# Altium footprint library Библиотека посадочных мест.PcbLib: 128 footprints (part 3 of 8)
Each footprint in its own frame and in the unit in brackets; x right, y up, seen from the top. Pads: shape width x height; smd on the part's side, far side on the other; paste and mask are expansions set on the pad; w line width, h text height; cw(c..) or ccw(c..) is an arc to the next point about the centre after c.
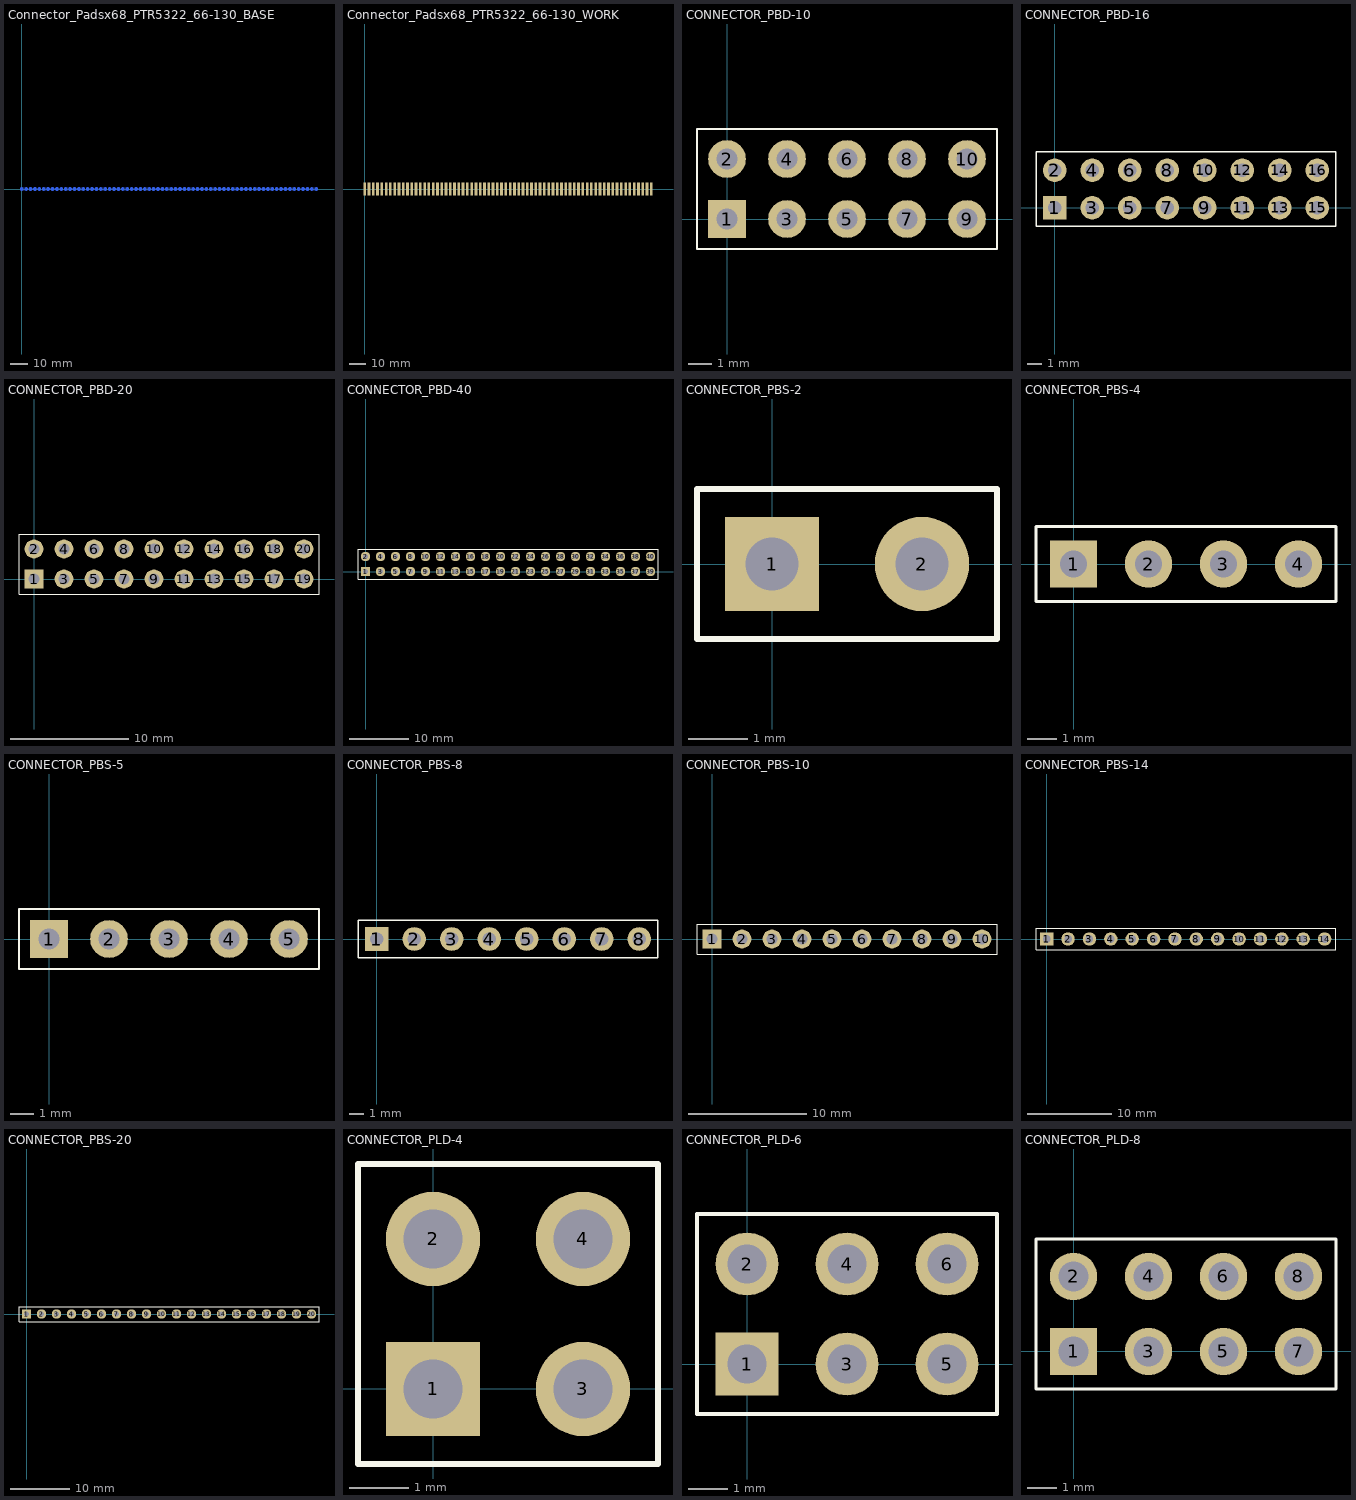
[diagram p2: the footprints below, top view; thin cyan lines are the x and y axes]

## Connector_Padsx68_PTR5322_66-130_BASE [mm]
pads (68):
  round 1.9 smd far side: 66(2.54,0) 67(5.08,0) 68(7.62,0) 69(10.16,0) 70(12.7,0) 71(15.24,0) 72(17.78,0) 73(20.32,0) 74(22.86,0) 75(25.4,0) 76(27.94,0) 77(30.48,0) 78(33.02,0) 79(35.56,0) 80(38.1,0) 81(40.64,0) 82(43.18,0) 83(45.72,0) 84(48.26,0) 85(50.8,0) 86(53.34,0) 87(55.88,0) 88(58.42,0) 89(60.96,0) 90(63.5,0) 91(66.04,0) 92(68.58,0) 93(71.12,0) 94(73.66,0) 95(76.2,0) 96(78.74,0) 97(81.28,0) 98(83.82,0) 99(86.36,0) 100(88.9,0) 101(91.44,0) 102(93.98,0) 103(96.52,0) 104(99.06,0) 105(101.6,0) 106(104.14,0) 107(106.68,0) 108(109.22,0) 109(111.76,0) 110(114.3,0) 111(116.84,0) 112(119.38,0) 113(121.92,0) 114(124.46,0) 115(127,0) 116(129.54,0) 117(132.08,0) 118(134.62,0) 119(137.16,0) 120(139.7,0) 121(142.24,0) 122(144.78,0) 123(147.32,0) 124(149.86,0) 125(152.4,0) 126(154.94,0) 127(157.48,0) 128(160.02,0) 129(162.56,0) 130(165.1,0) NC(0,0) NC(167.64,0) NC(170.18,0)
Bottom Overlay:
  lines w0.254: -1.587,-0.635 -1.587,-0.318 -1.587,1.587 0.953,1.587 171.767,1.587 171.767,-1.587 -0.635,-1.587 -1.587,-0.635
3D body "FKB 5322_1-04-65 (4).STEP": height 6.5, standoff 0, extent -1.27,-1.27 8.89,1.27
3D body "FKB 5322_1-04-65 (4).STEP": height 6.5, standoff 0, extent 29.21,-1.27 39.37,1.27
3D body "FKB 5322_1-04-65 (4).STEP": height 6.5, standoff 0, extent 39.37,-1.27 49.53,1.27
3D body "FKB 5322_1-04-65 (4).STEP": height 6.5, standoff 0, extent 49.53,-1.27 59.69,1.27
3D body "FKB 5322_1-04-65 (4).STEP": height 6.5, standoff 0, extent 59.69,-1.27 69.85,1.27
3D body "FKB 5322_1-04-65 (4).STEP": height 6.5, standoff 0, extent 69.85,-1.27 80.01,1.27
3D body "FKB 5322_1-04-65 (4).STEP": height 6.5, standoff 0, extent 80.01,-1.27 90.17,1.27
3D body "FKB 5322_1-04-65 (4).STEP": height 6.5, standoff 0, extent 90.17,-1.27 100.33,1.27
3D body "FKB 5322_1-04-65 (4).STEP": height 6.5, standoff 0, extent 100.33,-1.27 110.49,1.27
3D body "FKB 5322_1-04-65 (4).STEP": height 6.5, standoff 0, extent 110.49,-1.27 120.65,1.27
3D body "FKB 5322_1-04-65 (4).STEP": height 6.5, standoff 0, extent 120.65,-1.27 130.81,1.27
3D body "FKB 5322_1-04-65 (4).STEP": height 6.5, standoff 0, extent 130.81,-1.27 140.97,1.27
3D body "FKB 5322_1-04-65 (4).STEP": height 6.5, standoff 0, extent 140.97,-1.27 151.13,1.27
3D body "FKB 5322_1-04-65 (4).STEP": height 6.5, standoff 0, extent 151.13,-1.27 161.29,1.27
3D body "FKB 5322_1-04-65 (4).STEP": height 6.5, standoff 0, extent 161.29,-1.27 171.45,1.27
3D body "FKB 5322_1-04-65 (4).STEP": height 6.5, standoff 0, extent 19.05,-1.27 29.21,1.27
3D body "FKB 5322_1-04-65 (4).STEP": height 6.5, standoff 0, extent 8.89,-1.27 19.05,1.27

## Connector_Padsx68_PTR5322_66-130_WORK [mm]
pads (68):
  rect 1.6x8 smd: 66(2.54,0) 67(5.08,0) 68(7.62,0) 69(10.16,0) 70(12.7,0) 71(15.24,0) 72(17.78,0) 73(20.32,0) 74(22.86,0) 75(25.4,0) 76(27.94,0) 77(30.48,0) 78(33.02,0) 79(35.56,0) 80(38.1,0) 81(40.64,0) 82(43.18,0) 83(45.72,0) 84(48.26,0) 85(50.8,0) 86(53.34,0) 87(55.88,0) 88(58.42,0) 89(60.96,0) 90(63.5,0) 91(66.04,0) 92(68.58,0) 93(71.12,0) 94(73.66,0) 95(76.2,0) 96(78.74,0) 97(81.28,0) 98(83.82,0) 99(86.36,0) 100(88.9,0) 101(91.44,0) 102(93.98,0) 103(96.52,0) 104(99.06,0) 105(101.6,0) 106(104.14,0) 107(106.68,0) 108(109.22,0) 109(111.76,0) 110(114.3,0) 111(116.84,0) 112(119.38,0) 113(121.92,0) 114(124.46,0) 115(127,0) 116(129.54,0) 117(132.08,0) 118(134.62,0) 119(137.16,0) 120(139.7,0) 121(142.24,0) 122(144.78,0) 123(147.32,0) 124(149.86,0) 125(152.4,0) 126(154.94,0) 127(157.48,0) 128(160.02,0) 129(162.56,0) 130(165.1,0) NC(167.64,0) NC(170.18,0)
  rect 1.6x8 smd mask+0.102: NC(0,0)

## CONNECTOR_PBD-10 [mm]
pads (10):
  rect 1.6x1.6 hole 0.9: 1(0,0)
  round 1.6 hole 0.9: 2(0,2.54) 3(2.54,0) 4(2.54,2.54) 5(5.08,0) 6(5.08,2.54) 7(7.62,0) 8(7.62,2.54) 9(10.16,0) 10(10.16,2.54)
Top Overlay:
  lines w0.1: -1.27,-1.27 -1.27,1.27 -1.27,3.81 3.81,3.81 11.43,3.81 11.43,-1.27 3.81,-1.27 -1.27,-1.27
3D body "PBD-10.STEP": height 8.5, standoff -3.15, extent -1.27,-1.27 11.43,3.81

## CONNECTOR_PBD-16 [mm]
pads (16):
  rect 1.6x1.6 hole 0.9: 1(0,0)
  round 1.6 hole 0.9: 2(0,2.54) 3(2.54,0) 4(2.54,2.54) 5(5.08,0) 6(5.08,2.54) 7(7.62,0) 8(7.62,2.54) 9(10.16,0) 10(10.16,2.54) 11(12.7,0) 12(12.7,2.54) 13(15.24,0) 14(15.24,2.54) 15(17.78,0) 16(17.78,2.54)
Top Overlay:
  lines w0.1: -1.27,-1.27 3.81,-1.27 19.05,-1.27 19.05,3.81 3.81,3.81 -1.27,3.81 -1.27,1.27 -1.27,-1.27
3D body "PBD-16.STEP": height 8.5, standoff -3.15, extent -1.27,-1.27 19.05,3.81

## CONNECTOR_PBD-20 [mm]
pads (20):
  rect 1.6x1.6 hole 0.9: 1(0,0)
  round 1.6 hole 0.9: 2(0,2.54) 3(2.54,0) 4(2.54,2.54) 5(5.08,0) 6(5.08,2.54) 7(7.62,0) 8(7.62,2.54) 9(10.16,0) 10(10.16,2.54) 11(12.7,0) 12(12.7,2.54) 13(15.24,0) 14(15.24,2.54) 15(17.78,0) 16(17.78,2.54) 17(20.32,0) 18(20.32,2.54) 19(22.86,0) 20(22.86,2.54)
Top Overlay:
  lines w0.1: -1.27,-1.27 3.81,-1.27 8.89,-1.27 13.97,-1.27 24.13,-1.27 24.13,3.81 13.97,3.81 8.89,3.81 3.81,3.81 -1.27,3.81 -1.27,1.27 -1.27,-1.27
3D body "PBD-20.STEP": height 8.5, standoff -3.15, extent -1.27,-1.27 24.13,3.81

## CONNECTOR_PBD-40 [mm]
pads (40):
  rect 1.6x1.6 hole 0.9: 1(0,0)
  round 1.6 hole 0.9: 2(0,2.54) 3(2.54,0) 4(2.54,2.54) 5(5.08,0) 6(5.08,2.54) 7(7.62,0) 8(7.62,2.54) 9(10.16,0) 10(10.16,2.54) 11(12.7,0) 12(12.7,2.54) 13(15.24,0) 14(15.24,2.54) 15(17.78,0) 16(17.78,2.54) 17(20.32,0) 18(20.32,2.54) 19(22.86,0) 20(22.86,2.54) 21(25.4,0) 22(25.4,2.54) 23(27.94,0) 24(27.94,2.54) 25(30.48,0) 26(30.48,2.54) 27(33.02,0) 28(33.02,2.54) 29(35.56,0) 30(35.56,2.54) 31(38.1,0) 32(38.1,2.54) 33(40.64,0) 34(40.64,2.54) 35(43.18,0) 36(43.18,2.54) 37(45.72,0) 38(45.72,2.54) 39(48.26,0) 40(48.26,2.54)
Top Overlay:
  lines w0.1: -1.27,-1.27 -1.27,1.27 -1.27,3.81 3.81,3.81 8.89,3.81 13.97,3.81 49.53,3.81 49.53,-1.27 13.97,-1.27 8.89,-1.27 3.81,-1.27 -1.27,-1.27
3D body "PBD-40.STEP": height 8.5, standoff -3.15, extent -1.27,-1.27 49.53,3.81

## CONNECTOR_PBS-2 [mm]
pads (2):
  rect 1.6x1.6 hole 0.9: 1(0,0)
  round 1.6 hole 0.9: 2(2.54,0)
Top Overlay:
  lines w0.1: -1.27,-1.27 -1.27,1.27 3.81,1.27 3.81,-1.27 -1.27,-1.27
3D body "User Library-PBS-02.STEP": height 8.4, standoff -3.2, extent -1.27,-1.27 3.81,1.27

## CONNECTOR_PBS-4 [mm]
pads (4):
  rect 1.6x1.6 hole 0.9: 1(0,0)
  round 1.6 hole 0.9: 2(2.54,0) 3(5.08,0) 4(7.62,0)
Top Overlay:
  lines w0.1: -1.27,-1.27 -1.27,1.27 8.89,1.27 8.89,-1.27 -1.27,-1.27
3D body "User Library-PBS-04.step": height 8.4, standoff -3.2, extent -1.27,-1.27 8.89,1.27

## CONNECTOR_PBS-5 [mm]
pads (5):
  rect 1.6x1.6 hole 0.9: 1(0,0)
  round 1.6 hole 0.9: 2(2.54,0) 3(5.08,0) 4(7.62,0) 5(10.16,0)
Top Overlay:
  lines w0.1: -1.27,-1.27 11.43,-1.27 11.43,1.27 -1.27,1.27 -1.27,-1.27
3D body "PBS-5.STEP": height 8.5, standoff -3.15, extent -1.27,-1.27 11.43,1.27

## CONNECTOR_PBS-8 [mm]
pads (8):
  rect 1.6x1.6 hole 0.9: 1(0,0)
  round 1.6 hole 0.9: 2(2.54,0) 3(5.08,0) 4(7.62,0) 5(10.16,0) 6(12.7,0) 7(15.24,0) 8(17.78,0)
Top Overlay:
  lines w0.1: -1.27,-1.27 3.81,-1.27 8.89,-1.27 13.97,-1.27 19.05,-1.27 19.05,1.27 13.97,1.27 8.89,1.27 3.81,1.27 -1.27,1.27 -1.27,-1.27
3D body "PBS-8.STEP": height 8.5, standoff -3.15, extent -1.27,-1.27 19.05,1.27

## CONNECTOR_PBS-10 [mm]
pads (10):
  rect 1.6x1.6 hole 0.9: 1(0,0)
  round 1.6 hole 0.9: 2(2.54,0) 3(5.08,0) 4(7.62,0) 5(10.16,0) 6(12.7,0) 7(15.24,0) 8(17.78,0) 9(20.32,0) 10(22.86,0)
Top Overlay:
  lines w0.1: -1.27,-1.27 3.81,-1.27 8.89,-1.27 24.13,-1.27 24.13,1.27 8.89,1.27 3.81,1.27 -1.27,1.27 -1.27,-1.27
3D body "PBS-10.STEP": height 8.5, standoff -3.15, extent -1.27,-1.27 24.13,1.27

## CONNECTOR_PBS-14 [mm]
pads (14):
  rect 1.6x1.6 hole 0.9: 1(0,0)
  round 1.6 hole 0.9: 2(2.54,0) 3(5.08,0) 4(7.62,0) 5(10.16,0) 6(12.7,0) 7(15.24,0) 8(17.78,0) 9(20.32,0) 10(22.86,0) 11(25.4,0) 12(27.94,0) 13(30.48,0) 14(33.02,0)
Top Overlay:
  lines w0.1: -1.27,-1.27 -1.27,1.27 3.81,1.27 8.89,1.27 34.375,1.27 34.375,-1.27 8.89,-1.27 3.81,-1.27 -1.27,-1.27
3D body "User Library-pbs-14.STEP": height 8.4, standoff -3.2, extent -1.25,-1.29 34.31,1.25

## CONNECTOR_PBS-20 [mm]
pads (20):
  rect 1.6x1.6 hole 0.9: 1(0,0)
  round 1.6 hole 0.9: 2(2.54,0) 3(5.08,0) 4(7.62,0) 5(10.16,0) 6(12.7,0) 7(15.24,0) 8(17.78,0) 9(20.32,0) 10(22.86,0) 11(25.4,0) 12(27.94,0) 13(30.48,0) 14(33.02,0) 15(35.56,0) 16(38.1,0) 17(40.64,0) 18(43.18,0) 19(45.72,0) 20(48.26,0)
Top Overlay:
  lines w0.1: -1.27,-1.27 -1.27,1.27 3.81,1.27 8.89,1.27 49.53,1.27 49.53,-1.27 8.89,-1.27 3.81,-1.27 -1.27,-1.27
3D body "PBS-20.STEP": height 8.5, standoff -3.15, extent -1.27,-1.27 49.53,1.27

## CONNECTOR_PLD-4 [mm]
pads (4):
  rect 1.6x1.6 hole 1: 1(0,0)
  round 1.6 hole 1: 2(0,2.54) 3(2.54,0) 4(2.54,2.54)
Top Overlay:
  lines w0.1: -1.27,-1.27 -1.27,1.27 -1.27,3.81 3.81,3.81 3.81,1.27 3.81,-1.27 -1.27,-1.27
3D body "User Library-PLD-4.STEP": height 8.5, standoff -3, extent -1.23,-1.27 3.77,3.81

## CONNECTOR_PLD-6 [mm]
pads (6):
  rect 1.6x1.6 hole 1: 1(0,0)
  round 1.6 hole 1: 2(0,2.54) 3(2.54,0) 4(2.54,2.54) 5(5.08,0) 6(5.08,2.54)
Top Overlay:
  lines w0.1: -1.27,-1.27 -1.27,1.27 -1.27,3.81 3.81,3.81 6.35,3.81 6.35,1.27 6.35,-1.27 3.81,-1.27 -1.27,-1.27
3D body "PLS-3.STEP": height 8.8, standoff -3, extent -1.27,-1.27 6.35,1.27
3D body "PLS-3.STEP": height 8.8, standoff -3, extent -1.27,1.27 6.35,3.81

## CONNECTOR_PLD-8 [mm]
pads (8):
  rect 1.6x1.6 hole 1: 1(0,0)
  round 1.6 hole 1: 2(0,2.54) 3(2.54,0) 4(2.54,2.54) 5(5.08,0) 6(5.08,2.54) 7(7.62,0) 8(7.62,2.54)
Top Overlay:
  lines w0.1: -1.27,-1.27 -1.27,1.27 -1.27,3.81 3.81,3.81 8.89,3.81 8.89,1.27 8.89,-1.27 3.81,-1.27 -1.27,-1.27
3D body "PLS-4.STEP": height 8.8, standoff -3, extent -1.27,1.27 8.89,3.81
3D body "PLS-4.STEP": height 8.8, standoff -3, extent -1.27,-1.27 8.89,1.27